# Altium footprint library 医疗床16x16.PcbLib: 38 footprints (part 1 of 3)
Each footprint in its own frame and in the unit in brackets; x right, y up, seen from the top. Pads: shape width x height; smd on the part's side, far side on the other; paste and mask are expansions set on the pad; w line width, h text height; cw(c..) or ccw(c..) is an arc to the next point about the centre after c.
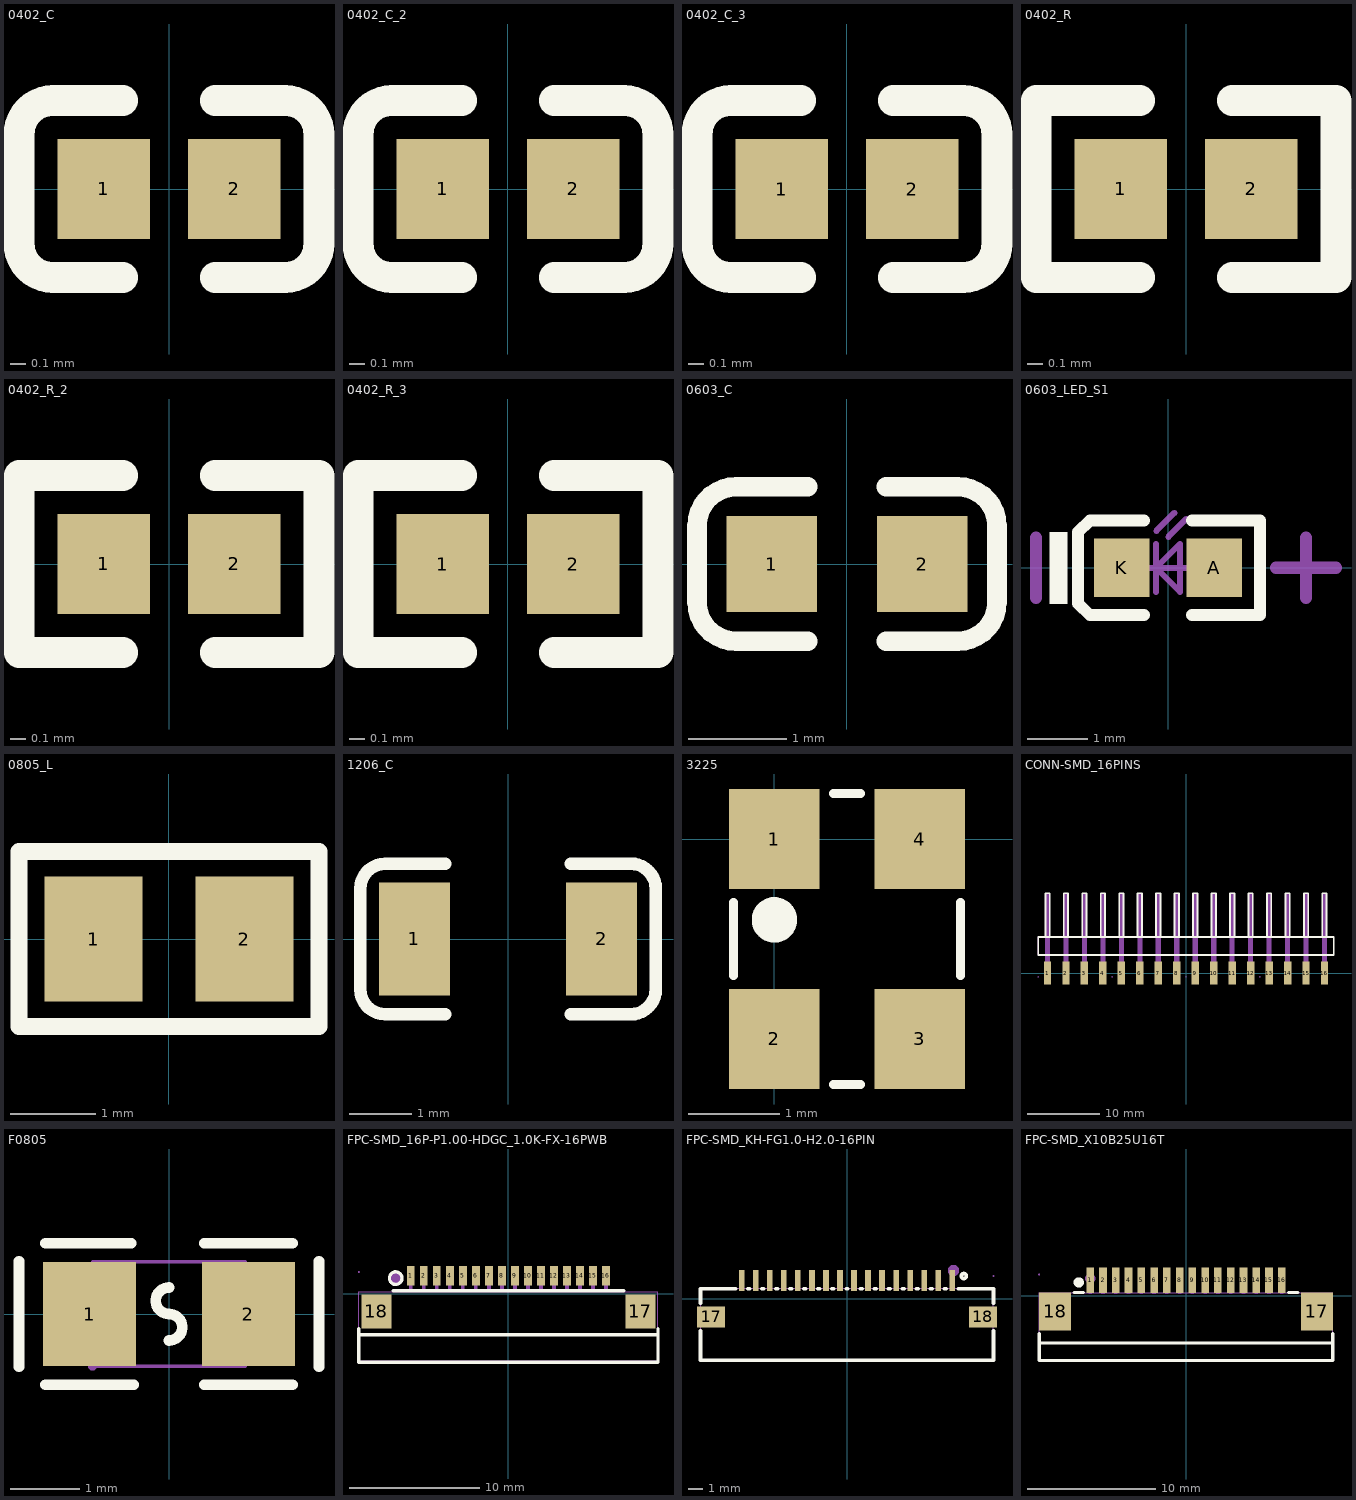
[diagram p0: the footprints below, top view; thin cyan lines are the x and y axes]

## 0402_C [mm]
pads (2):
  rect 0.6x0.65 smd mask+0.051: 1(-0.425,0) 2(0.425,0)
Top Overlay:
  lines w0.2: -0.755,-0.575 cw(c-0.755,-0.355) -0.975,-0.355 -0.975,0.355 cw(c-0.755,0.355) -0.755,0.575 ; -0.75,-0.575 -0.3,-0.575 ; -0.75,0.575 -0.3,0.575 ; 0.3,-0.575 0.75,-0.575 ; 0.3,0.575 0.75,0.575 ; 0.755,-0.575 ccw(c0.755,-0.355) 0.975,-0.355 0.975,0.355 ccw(c0.755,0.355) 0.755,0.575
3D body "0402 SMD Capacitor.step": height 0.2, standoff 0, extent -0.483,-0.3 0.518,0.3

## 0402_C_2 [mm]
pads (2):
  rect 0.6x0.65 smd mask+0.051: 1(-0.425,0) 2(0.425,0)
Top Overlay:
  lines w0.2: -0.755,-0.575 cw(c-0.755,-0.355) -0.975,-0.355 -0.975,0.355 cw(c-0.755,0.355) -0.755,0.575 ; -0.75,-0.575 -0.3,-0.575 ; -0.75,0.575 -0.3,0.575 ; 0.3,-0.575 0.75,-0.575 ; 0.3,0.575 0.75,0.575 ; 0.755,-0.575 ccw(c0.755,-0.355) 0.975,-0.355 0.975,0.355 ccw(c0.755,0.355) 0.755,0.575
3D body "0402 SMD Capacitor.step": height 0.2, standoff 0, extent -0.483,-0.3 0.517,0.3

## 0402_C_3 [mm]
pads (2):
  rect 0.6x0.65 smd mask+0.051: 1(-0.425,0) 2(0.425,0)
Top Overlay:
  lines w0.2: -0.755,-0.575 cw(c-0.755,-0.355) -0.975,-0.355 -0.975,0.355 cw(c-0.755,0.355) -0.755,0.575 ; -0.75,-0.575 -0.3,-0.575 ; -0.75,0.575 -0.3,0.575 ; 0.3,-0.575 0.75,-0.575 ; 0.3,0.575 0.75,0.575 ; 0.755,-0.575 ccw(c0.755,-0.355) 0.975,-0.355 0.975,0.355 ccw(c0.755,0.355) 0.755,0.575
3D body "0402 SMD Capacitor.step": height 0.2, standoff 0, extent -0.483,-0.3 0.517,0.3

## 0402_R [mm]
pads (2):
  rect 0.6x0.65 smd mask+0.051: 1(-0.425,0) 2(0.425,0)
Top Overlay:
  lines w0.2: -0.3,-0.575 -0.975,-0.575 -0.975,0.575 -0.3,0.575 ; 0.3,-0.575 0.975,-0.575 0.975,0.575 0.3,0.575
3D body "User Library-RES_1005-0402.STEP": height 0.41, standoff 0, extent -0.575,-0.275 0.575,0.275

## 0402_R_2 [mm]
pads (2):
  rect 0.6x0.65 smd mask+0.051: 1(-0.425,0) 2(0.425,0)
Top Overlay:
  lines w0.2: -0.3,-0.575 -0.975,-0.575 -0.975,0.575 -0.3,0.575 ; 0.3,-0.575 0.975,-0.575 0.975,0.575 0.3,0.575
3D body "User Library-RES_1005-0402.STEP": height 0.41, standoff 0, extent -0.575,-0.275 0.575,0.275

## 0402_R_3 [mm]
pads (2):
  rect 0.6x0.65 smd mask+0.051: 1(-0.425,0) 2(0.425,0)
Top Overlay:
  lines w0.2: -0.3,-0.575 -0.975,-0.575 -0.975,0.575 -0.3,0.575 ; 0.3,-0.575 0.975,-0.575 0.975,0.575 0.3,0.575
3D body "User Library-RES_1005-0402.STEP": height 0.41, standoff 0, extent -0.575,-0.275 0.575,0.275

## 0603_C [mm]
pads (2):
  rect 0.93x0.98 smd: 1(-0.77,0) 2(0.77,0)
Top Overlay:
  lines w0.2: -0.4,-0.79 -1.135,-0.79 cw(c-1.135,-0.39) -1.535,-0.39 -1.535,0.39 cw(c-1.135,0.39) -1.135,0.79 -0.4,0.79 ; 0.4,-0.79 1.135,-0.79 ccw(c1.135,-0.39) 1.535,-0.39 1.535,0.39 ccw(c1.135,0.39) 1.135,0.79 0.4,0.79
3D body "User Library-0603 SMD Capacitor.STEP": height 0.3, standoff 0, extent -0.8,-0.4 0.8,0.4

## 0603_LED_S1 [mm]
pads (2):
  rect 0.93x0.98 smd: A(0.77,0) K(-0.77,0)
Top Overlay:
  rectangle: -1.975,-0.6 -1.675,0.6
  lines w0.2: -0.4,-0.79 -1.3,-0.79 -1.5,-0.597 -1.5,0.597 -1.3,0.79 -0.4,0.79 ; 0.4,-0.79 1.535,-0.79 1.535,0.79 0.4,0.79
Mechanical 13:
  lines w0.1: -0.4,0 0.4,0 ; -0.2,-0.4 -0.2,0.4 ; -0.195,0.617 0.105,0.917 ; 0.005,0.517 0.305,0.817 ; -0.2,0 0.2,0.4 0.2,-0.4 -0.2,0
Mechanical 15:
  lines w0.203: -2.2,-0.5 -2.2,0.5 ; 1.8,0 2.8,0 ; 2.3,-0.5 2.3,0.5
3D body "User Library-LED_0603_R.STEP": height 0.6, standoff 0, extent -0.8,-0.4 0.8,0.4

## 0805_L [mm]
pads (2):
  rect 1.16x1.47 smd: 1(-0.89,0) 2(0.89,0)
Top Overlay:
  lines w0.2: -1.77,-1.035 -1.77,1.035 1.77,1.035 1.77,-1.035 -1.77,-1.035
3D body "L0805.STEP": height 0.6, standoff -0.02, extent -0.998,-0.638 1.005,0.637

## 1206_C [mm]
pads (2):
  rect 1.13x1.8 smd: 1(-1.49,0) 2(1.49,0)
Top Overlay:
  lines w0.2: -1,-1.2 -1.955,-1.2 cw(c-1.955,-0.8) -2.355,-0.8 -2.355,0.8 cw(c-1.955,0.8) -1.955,1.2 -1,1.2 ; 1,-1.2 1.955,-1.2 ccw(c1.955,-0.8) 2.355,-0.8 2.355,0.8 ccw(c1.955,0.8) 1.955,1.2 1,1.2
3D body "C1206.STEP": height 1, standoff 0, extent -1.602,-0.813 1.598,0.787

## 3225 [mm]
pads (4):
  rect 1x1.1 smd: 1(0,0) 2(0,-2.2) 3(1.6,-2.2) 4(1.6,0)
Top Overlay:
  circle w0.25: c0.002,-0.889 r0.125
  lines w0.1: -0.45,-1.5 -0.45,-0.7 ; 0.65,-2.7 0.95,-2.7 ; 0.65,0.5 0.95,0.5 ; 2.05,-1.5 2.05,-0.7
3D body "NDK NX3225SA.STEP": height 0.6, standoff 0, extent -0.503,-2.775 2.017,0.445

## CONN-SMD_16PINS [mm] "16PINS_Horizontal Surface Mount_Switch arrangement"
pads (16):
  rect 1.02x3.17 smd mask+0.05: 1(-19.05,0) 2(-16.51,0) 3(-13.97,0) 4(-11.43,0) 5(-8.89,0) 6(-6.35,0) 7(-3.81,0) 8(-1.27,0) 9(1.27,0) 10(3.81,0) 11(6.35,0) 12(8.89,0) 13(11.43,0) 14(13.97,0) 15(16.51,0) 16(19.05,0)
Top Overlay:
  lines w0.254: -20.32,2.5 -20.32,5 -10.16,5 0,5 10.16,5 20.32,5 20.32,2.5 10.16,2.5 0,2.5 -10.16,2.5 -20.32,2.5 ; -19.35,5.001 -19.35,11.001 -18.75,11.001 -18.75,5.001 -19.35,5.001 ; -16.81,5.001 -16.81,11.001 -16.21,11.001 -16.21,5.001 -16.81,5.001 ; -14.27,5.001 -14.27,11.001 -13.67,11.001 -13.67,5.001 -14.27,5.001 ; -11.73,5.001 -11.73,11.001 -11.13,11.001 -11.13,5.001 -11.73,5.001 ; -9.19,5.001 -9.19,11.001 -8.59,11.001 -8.59,5.001 -9.19,5.001 ; -6.65,5.001 -6.65,11.001 -6.05,11.001 -6.05,5.001 -6.65,5.001 ; -4.11,5.001 -4.11,11.001 -3.51,11.001 -3.51,5.001 -4.11,5.001 ; -1.57,5.001 -1.57,11.001 -0.97,11.001 -0.97,5.001 -1.57,5.001 ; 0.97,5.001 0.97,11.001 1.57,11.001 1.57,5.001 0.97,5.001 ; 3.51,5.001 3.51,11.001 4.11,11.001 4.11,5.001 3.51,5.001 ; 6.05,5.001 6.05,11.001 6.65,11.001 6.65,5.001 6.05,5.001 ; 8.59,5.001 8.59,11.001 9.19,11.001 9.19,5.001 8.59,5.001 ; 11.13,5.001 11.13,11.001 11.73,11.001 11.73,5.001 11.13,5.001 ; 13.67,5.001 13.67,11.001 14.27,11.001 14.27,5.001 13.67,5.001 ; 16.21,5.001 16.21,11.001 16.81,11.001 16.81,5.001 16.21,5.001 ; 18.75,5.001 18.75,11.001 19.35,11.001 19.35,5.001 18.75,5.001
Mechanical 6:
  region: 18.73,4.92 19.37,4.92 19.37,10.985 18.735,10.985
  region: 16.19,4.92 16.83,4.92 16.83,10.985 16.195,10.985
  region: 13.65,4.92 14.29,4.92 14.29,10.985 13.655,10.985
  region: 11.11,4.92 11.75,4.92 11.75,10.985 11.115,10.985
  region: 8.57,4.92 9.21,4.92 9.21,10.985 8.575,10.985
  region: 6.03,4.92 6.67,4.92 6.67,10.985 6.035,10.985
  region: 3.49,4.92 4.13,4.92 4.13,10.985 3.495,10.985
  region: 0.95,4.92 1.59,4.92 1.59,10.985 0.955,10.985
  region: -1.59,4.92 -0.95,4.92 -0.95,10.985 -1.585,10.985
  region: -4.13,4.92 -3.49,4.92 -3.49,10.985 -4.125,10.985
  region: -6.67,4.92 -6.03,4.92 -6.03,10.985 -6.665,10.985
  region: -9.21,4.92 -8.57,4.92 -8.57,10.985 -9.205,10.985
  region: -11.75,4.92 -11.11,4.92 -11.11,10.985 -11.745,10.985
  region: -14.29,4.92 -13.65,4.92 -13.65,10.985 -14.285,10.985
  region: -16.83,4.92 -16.19,4.92 -16.19,10.985 -16.825,10.985
  region: -19.37,4.92 -18.73,4.92 -18.73,10.985 -19.365,10.985
Mechanical 15:
  drawing of 46 lines, arcs and shapes, not listed

## F0805 [mm]
pads (2):
  rect 1.335x1.5 smd mask+0.051: 1(-1.142,0) 2(1.142,0)
Top Overlay:
  lines w0.152: -2.159,-0.762 -2.159,0.762 ; -1.778,-1.016 -0.508,-1.016 ; -1.778,1.016 -0.545,1.016 ; 0,-0.381 ccw(c0,-0.191) 0,0 cw(c0,0.191) 0,0.381 ; 0.508,-1.016 1.778,-1.016 ; 0.508,1.016 1.778,1.016 ; 2.159,-0.762 2.159,0.762
Top Paste:
  region: 0.475,-0.62 0.475,-0.2 0.92,-0.2 0.92,0.25 0.48,0.25 0.475,0.66 0.525,0.71 1.675,0.71 1.725,0.66 1.725,-0.62 1.675,-0.67 0.525,-0.67
  region: -1.675,-0.62 -1.675,0.66 -1.625,0.71 -0.475,0.71 -0.425,0.66 -0.42,0.25 -0.87,0.25 -0.87,-0.2 -0.43,-0.2 -0.425,-0.62 -0.475,-0.67 -1.625,-0.67
Mechanical 15:
  region: 1.1,-0.75 0.9,-0.75 0.9,0.75 1.1,0.75
  region: -1.1,0.75 -0.9,0.75 -0.9,-0.75 -1.1,-0.75
  region: -1.04,-0.75 -1.04,-0.725 -1.075,-0.69 -1.125,-0.69 -1.16,-0.725 -1.16,-0.75 -1.16,-0.775 -1.125,-0.81 -1.075,-0.81 -1.04,-0.775
  lines w0.051: -1.1,-0.75 1.1,-0.75 1.1,0.75 -1.1,0.75 -1.1,-0.75
3D body "3D_SL0805150_2022-11-23.step": height 0.75, standoff -0.05, extent -1.05,-0.7 1.05,0.7

## FPC-SMD_16P-P1.00-HDGC_1.0K-FX-16PWB [mm]
pads (18):
  rect 0.6x1.5 smd mask+0.05: 1(-7.5,1.375) 2(-6.5,1.375) 3(-5.5,1.375) 4(-4.5,1.375) 5(-3.5,1.375) 6(-2.5,1.375) 7(-1.5,1.375) 8(-0.5,1.375) 9(0.5,1.375) 10(1.5,1.375) 11(2.5,1.375) 12(3.5,1.375) 13(4.5,1.375) 14(5.5,1.375) 15(6.5,1.375) 16(7.5,1.375)
  rect 2.3x2.6 smd mask+0.05: 17(10.15,-1.375) 18(-10.15,-1.375)
Top Overlay:
  circle w0.254: c-8.663,1.183 r0.484
  lines w0.254: -11.5,-3.179 11.5,-3.179 ; -11.5,-2.688 -11.5,-5.271 11.5,-5.271 11.5,-2.688 ; -8.857,0.205 8.857,0.205
Mechanical 6:
  circle w0.5: c-8.648,1.186 r0.25
Mechanical 15:
  drawing of 39 lines, arcs and shapes, not listed
3D body "3D_16P抽屉下接_2023-06-27.step": height 2.58, standoff 0.05, extent -11.5,-5.152 11.5,1.648

## FPC-SMD_KH-FG1.0-H2.0-16PIN [mm] "FPC_16PINS_1MM_Drawer_lower contact"
pads (18):
  rect 0.4x1.5 smd mask+0.05: 1(7.5,1.3) 2(6.5,1.3) 3(5.5,1.3) 4(4.5,1.3) 5(3.5,1.3) 6(2.5,1.3) 7(1.5,1.3) 8(0.5,1.3) 9(-0.5,1.3) 10(-1.5,1.3) 11(-2.5,1.3) 12(-3.5,1.3) 13(-4.5,1.3) 14(-5.5,1.3) 15(-6.5,1.3) 16(-7.5,1.3)
  rect 2x1.5 smd mask+0.05: 17(-9.7,-1.3) 18(9.7,-1.3)
Top Overlay:
  circle w0.254: c8.335,1.608 r0.18
  lines w0.254: -10.45,-2.281 -10.45,-2.481 -10.45,-4.392 10.45,-4.392 10.45,-2.481 10.45,-2.281 ; -10.45,-0.319 -10.45,0.7 -7.931,0.7 ; -7.069,0.7 -6.931,0.7 ; -6.069,0.7 -5.931,0.7 ; -5.069,0.7 -4.931,0.7 ; -4.069,0.7 -3.931,0.7 ; -3.069,0.7 -2.931,0.7 ; -2.069,0.7 -1.931,0.7 ; -1.069,0.7 -0.931,0.7 ; -0.069,0.7 0.069,0.7 ; 0.931,0.7 1.069,0.7 ; 1.931,0.7 2.069,0.7 ; 2.931,0.7 3.069,0.7 ; 3.931,0.7 4.069,0.7 ; 4.931,0.7 5.069,0.7 ; 5.931,0.7 6.069,0.7 ; 6.931,0.7 7.069,0.7 ; 7.931,0.7 10.45,0.7 10.45,-0.319
Mechanical 6:
  circle w0.4: c7.6,2 r0.2
Mechanical 15:
  region: 10.4,-1.8 9,-1.8 9,-0.8 10.4,-0.8
  region: -9,-1.8 -10.4,-1.8 -10.4,-0.8 -9,-0.8
  region: 7.6,0.6 7.4,0.6 7.4,1.6 7.6,1.6
  region: 6.6,0.6 6.4,0.6 6.4,1.6 6.6,1.6
  region: 5.6,0.6 5.4,0.6 5.4,1.6 5.6,1.6
  region: 4.6,0.6 4.4,0.6 4.4,1.6 4.6,1.6
  region: 3.6,0.6 3.4,0.6 3.4,1.6 3.6,1.6
  region: 2.6,0.6 2.4,0.6 2.4,1.6 2.6,1.6
  region: 1.6,0.6 1.4,0.6 1.4,1.6 1.6,1.6
  region: 0.6,0.6 0.4,0.6 0.4,1.6 0.6,1.6
  region: -0.4,0.6 -0.6,0.6 -0.6,1.6 -0.4,1.6
  region: -1.4,0.6 -1.6,0.6 -1.6,1.6 -1.4,1.6
  region: -2.4,0.6 -2.6,0.6 -2.6,1.6 -2.4,1.6
  region: -3.4,0.6 -3.6,0.6 -3.6,1.6 -3.4,1.6
  region: -4.4,0.6 -4.6,0.6 -4.6,1.6 -4.4,1.6
  region: -5.4,0.6 -5.6,0.6 -5.6,1.6 -5.4,1.6
  region: -6.4,0.6 -6.6,0.6 -6.6,1.6 -6.4,1.6
  region: -7.4,0.6 -7.6,0.6 -7.6,1.6 -7.4,1.6
  region: 10.51,1.6 10.51,1.625 10.475,1.66 10.425,1.66 10.39,1.625 10.39,1.6 10.39,1.575 10.425,1.54 10.475,1.54 10.51,1.575
  lines w0.051: -10.45,-4.4 10.45,-4.4 10.45,0.75 -10.45,0.75 -10.45,-4.4
3D body "3D_KH-FG1.0-H2.0-16PIN_2022-11-23.step": height 1.96, standoff -0.05, extent -10.45,-4.4 10.45,1.6

## FPC-SMD_X10B25U16T [mm]
pads (18):
  rect 0.6x2 smd mask+0.051: 1(-7.5,1.225) 2(-6.5,1.225) 3(-5.5,1.225) 4(-4.5,1.225) 5(-3.5,1.225) 6(-2.5,1.225) 7(-1.5,1.225) 8(-0.5,1.225) 9(0.5,1.225) 10(1.5,1.225) 11(2.5,1.225) 12(3.5,1.225) 13(4.5,1.225) 14(5.5,1.225) 15(6.5,1.225) 16(7.5,1.225)
  rect 2.5x3 smd mask+0.051: 17(10.25,-1.225) 18(-10.25,-1.225)
Top Overlay:
  circle w0.4: c-8.4,1.05 r0.2
  lines w0.254: -11.5,-3.878 -11.5,-3.703 11.499,-3.703 ; -11.5,-2.956 -11.5,-5.08 -10.24,-5.08 10.24,-5.08 11.5,-5.08 11.5,-2.956 ; -8.769,0.25 -8.031,0.25 ; 8.031,0.25 8.769,0.25
Mechanical 6:
  circle w0.4: c-7.5,1.35 r0.2
Mechanical 15:
  region: -11.44,1.67 -11.44,1.695 -11.475,1.73 -11.525,1.73 -11.56,1.695 -11.56,1.67 -11.56,1.645 -11.525,1.61 -11.475,1.61 -11.44,1.645
  region: 7.375,1.67 7.625,1.67 7.625,0.17 7.375,0.17
  region: 6.375,1.67 6.625,1.67 6.625,0.17 6.375,0.17
  region: 5.375,1.67 5.625,1.67 5.625,0.17 5.375,0.17
  region: 4.375,1.67 4.625,1.67 4.625,0.17 4.375,0.17
  region: 3.375,1.67 3.625,1.67 3.625,0.17 3.375,0.17
  region: 2.375,1.67 2.625,1.67 2.625,0.17 2.375,0.17
  region: 1.375,1.67 1.625,1.67 1.625,0.17 1.375,0.17
  region: 0.375,1.67 0.625,1.67 0.625,0.17 0.375,0.17
  region: -0.625,1.67 -0.375,1.67 -0.375,0.17 -0.625,0.17
  region: -1.625,1.67 -1.375,1.67 -1.375,0.17 -1.625,0.17
  region: -2.625,1.67 -2.375,1.67 -2.375,0.17 -2.625,0.17
  region: -3.625,1.67 -3.375,1.67 -3.375,0.17 -3.625,0.17
  region: -4.625,1.67 -4.375,1.67 -4.375,0.17 -4.625,0.17
  region: -5.625,1.67 -5.375,1.67 -5.375,0.17 -5.625,0.17
  region: -6.625,1.67 -6.375,1.67 -6.375,0.17 -6.625,0.17
  region: -7.625,1.67 -7.375,1.67 -7.375,0.17 -7.625,0.17
  region: 9.3,-2.03 9.3,-0.23 11.2,-0.23 11.2,-2.03
  region: -11.2,-2.03 -11.2,-0.23 -9.3,-0.23 -9.3,-2.03
  lines w0.051: -11.5,-5.08 -11.5,0.22 11.5,0.22 11.5,-5.08 -11.5,-5.08
3D body "3D_16P抽屉上接_2023-06-27.step": height 2.46, standoff -0.05, extent -11.5,-5.375 11.5,1.375